# Altium schematic symbol library Capacitor - Aluminium TH.SchLib: 4591 symbols (part 14 of 27) (continued)
## SEK221M063ST (continued)
CAP ALUM 220UF 20% 63V RADIAL; Part Number: SEK221M063ST; Manufacturer: Cornell Dubilier Electronics (CDE); TemperatureRange: -55C ~ 105C; Ripple Current: 460mA; Value: 220uF; PartId: 25713; Supplier 1: Digi-Key; Supplier Part Number 1: 338-1737-ND; ComponentLink1Description: Datasheet; ComponentLink1URL: http://www.cde.com/resources/catalogs/SEK.pdf; ComponentLink2Description: Digi-Key Listing; ComponentLink2URL: https://www.digikey.com/product-detail/en/cornell-dubilier-electronics-cde/SEK221M063ST/338-1737-ND/1627155; Tolerance: 20%; Voltage: 63V; Price: 1.18; Device Package: Radial, Can, 10mm
footprint CAP AL TH D10 L5 H22
pins: 1, 2

## SEK221M100ST
designator C?, comment 220uF  (value not drawn)
CAP ALUM 220UF 20% 100V RADIAL; Part Number: SEK221M100ST; Manufacturer: Cornell Dubilier Electronics (CDE); TemperatureRange: -55C ~ 105C; Ripple Current: 590mA; Value: 220uF; PartId: 26713; Supplier 1: Digi-Key; Supplier Part Number 1: 338-2340-ND; ComponentLink1Description: Datasheet; ComponentLink1URL: http://www.cde.com/resources/catalogs/SEK.pdf; ComponentLink2Description: Digi-Key Listing; ComponentLink2URL: https://www.digikey.com/product-detail/en/cornell-dubilier-electronics-cde/SEK221M100ST/338-2340-ND/1627156; Tolerance: 20%; Voltage: 100V; Price: 2.45; Device Package: Radial, Can, 16mm
footprint CAP AL TH D16 L7.5 H26.5
pins: 1, 2

## SEK330M400ST
designator C?, comment 33uF  (value not drawn)
CAP ALUM 33UF 20% 400V RADIAL; Part Number: SEK330M400ST; Manufacturer: Cornell Dubilier Electronics (CDE); TemperatureRange: -40C ~ 105C; Ripple Current: 205mA; Value: 33uF; PartId: 27259; Supplier 1: Digi-Key; Supplier Part Number 1: 338-2346-ND; ComponentLink1Description: Datasheet; ComponentLink1URL: http://www.cde.com/resources/catalogs/SEK.pdf; ComponentLink2Description: Digi-Key Listing; ComponentLink2URL: https://www.digikey.com/product-detail/en/cornell-dubilier-electronics-cde/SEK330M400ST/338-2346-ND/1627183; Tolerance: 20%; Voltage: 400V; Price: 2.82; Device Package: Radial, Can, 16mm
footprint CAP AL TH D16 L7.5 H33.5
pins: 1, 2

## SEK331M035ST
designator C?, comment 330uF  (value not drawn)
CAP ALUM 330UF 20% 35V RADIAL; Part Number: SEK331M035ST; Manufacturer: Cornell Dubilier Electronics (CDE); TemperatureRange: -55C ~ 105C; Ripple Current: 440mA; Value: 330uF; PartId: 25425; Supplier 1: Digi-Key; Supplier Part Number 1: 338-1741-ND; ComponentLink1Description: Datasheet; ComponentLink1URL: http://www.cde.com/resources/catalogs/SEK.pdf; ComponentLink2Description: Digi-Key Listing; ComponentLink2URL: https://www.digikey.com/product-detail/en/cornell-dubilier-electronics-cde/SEK331M035ST/338-1741-ND/1627187; Tolerance: 20%; Voltage: 35V; Price: 1.03; Device Package: Radial, Can, 10mm
footprint CAP AL TH D10 L5 H17.5
pins: 1, 2

## SEK331M050ST
designator C?, comment 330uF  (value not drawn)
CAP ALUM 330UF 20% 50V RADIAL; Part Number: SEK331M050ST; Manufacturer: Cornell Dubilier Electronics (CDE); TemperatureRange: -55C ~ 105C; Ripple Current: 535mA; Value: 330uF; PartId: 25714; Supplier 1: Digi-Key; Supplier Part Number 1: 338-1748-ND; ComponentLink1Description: Datasheet; ComponentLink1URL: http://www.cde.com/resources/catalogs/SEK.pdf; ComponentLink2Description: Digi-Key Listing; ComponentLink2URL: https://www.digikey.com/product-detail/en/cornell-dubilier-electronics-cde/SEK331M050ST/338-1748-ND/1627188; Tolerance: 20%; Voltage: 50V; Price: 1.18; Device Package: Radial, Can, 10mm
footprint CAP AL TH D10 L5 H22
pins: 1, 2

## SEK331M100ST
designator C?, comment 330uF  (value not drawn)
CAP ALUM 330UF 20% 100V RADIAL; Part Number: SEK331M100ST; Manufacturer: Cornell Dubilier Electronics (CDE); TemperatureRange: -55C ~ 105C; Ripple Current: 720mA; Value: 330uF; PartId: 26728; Supplier 1: Digi-Key; Supplier Part Number 1: 338-2347-ND; ComponentLink1Description: Datasheet; ComponentLink1URL: http://www.cde.com/resources/catalogs/SEK.pdf; ComponentLink2Description: Digi-Key Listing; ComponentLink2URL: https://www.digikey.com/product-detail/en/cornell-dubilier-electronics-cde/SEK331M100ST/338-2347-ND/1627190; Tolerance: 20%; Voltage: 100V; Price: 2.92; Device Package: Radial, Can, 16mm
footprint CAP AL TH D16 L7.5 H26.5
pins: 1, 2

## SEK332M025ST
designator C?, comment 3300uF  (value not drawn)
CAP ALUM 3300UF 20% 25V RADIAL; Part Number: SEK332M025ST; Manufacturer: Cornell Dubilier Electronics (CDE); TemperatureRange: -55C ~ 105C; Ripple Current: 1.45A; Value: 3300uF; PartId: 27248; Supplier 1: Digi-Key; Supplier Part Number 1: 338-2349-ND; ComponentLink1Description: Datasheet; ComponentLink1URL: http://www.cde.com/resources/catalogs/SEK.pdf; ComponentLink2Description: Digi-Key Listing; ComponentLink2URL: https://www.digikey.com/product-detail/en/cornell-dubilier-electronics-cde/SEK332M025ST/338-2349-ND/1627195; Tolerance: 20%; Voltage: 25V; Price: 2.65; Device Package: Radial, Can, 16mm
footprint CAP AL TH D16 L7.5 H33.5
pins: 1, 2

## SEK470M100ST
designator C?, comment 47uF  (value not drawn)
CAP ALUM 47UF 20% 100V RADIAL; Part Number: SEK470M100ST; Manufacturer: Cornell Dubilier Electronics (CDE); TemperatureRange: -55C ~ 105C; Ripple Current: 210mA; Value: 47uF; PartId: 25416; Supplier 1: Digi-Key; Supplier Part Number 1: 338-2355-ND; ComponentLink1Description: Datasheet; ComponentLink1URL: http://www.cde.com/resources/catalogs/SEK.pdf; ComponentLink2Description: Digi-Key Listing; ComponentLink2URL: https://www.digikey.com/product-detail/en/cornell-dubilier-electronics-cde/SEK470M100ST/338-2355-ND/1627212; Tolerance: 20%; Voltage: 100V; Price: 0.95; Device Package: Radial, Can, 10mm
footprint CAP AL TH D10 L5 H17.5
pins: 1, 2

## SEK471M025ST
designator C?, comment 470uF  (value not drawn)
CAP ALUM 470UF 20% 25V RADIAL; Part Number: SEK471M025ST; Manufacturer: Cornell Dubilier Electronics (CDE); TemperatureRange: -55C ~ 105C; Ripple Current: 470mA; Value: 470uF; PartId: 25443; Supplier 1: Digi-Key; Supplier Part Number 1: 338-1715-ND; ComponentLink1Description: Datasheet; ComponentLink1URL: http://www.cde.com/resources/catalogs/SEK.pdf; ComponentLink2Description: Digi-Key Listing; ComponentLink2URL: https://www.digikey.com/product-detail/en/cornell-dubilier-electronics-cde/SEK471M025ST/338-1715-ND/1627220; Tolerance: 20%; Voltage: 25V; Price: 3.29; Device Package: Radial, Can, 10mm
footprint CAP AL TH D10 L5 H17.5
pins: 1, 2

## SEK472M016ST
designator C?, comment 4700uF  (value not drawn)
CAP ALUM 4700UF 20% 16V RADIAL; Part Number: SEK472M016ST; Manufacturer: Cornell Dubilier Electronics (CDE); TemperatureRange: -55C ~ 105C; Ripple Current: 1.56A; Value: 4700uF; PartId: 27285; Supplier 1: Digi-Key; Supplier Part Number 1: 338-2357-ND; ComponentLink1Description: Datasheet; ComponentLink1URL: http://www.cde.com/resources/catalogs/SEK.pdf; ComponentLink2Description: Digi-Key Listing; ComponentLink2URL: https://www.digikey.com/product-detail/en/cornell-dubilier-electronics-cde/SEK472M016ST/338-2357-ND/1627227; Tolerance: 20%; Voltage: 16V; Price: 3.23; Device Package: Radial, Can, 16mm
footprint CAP AL TH D16 L7.5 H33.5
pins: 1, 2

## SK2R2M450ST
designator C?, comment 2.2uF  (value not drawn)
CAP ALUM 2.2UF 20% 450V RADIAL; Part Number: SK2R2M450ST; Manufacturer: Cornell Dubilier Electronics (CDE); TemperatureRange: -25C ~ 85C; Ripple Current: 29mA; Value: 2.2uF; PartId: 25406; Supplier 1: Digi-Key; Supplier Part Number 1: 338-2384-ND; ComponentLink1Description: Datasheet; ComponentLink1URL: http://www.cde.com/resources/catalogs/SK.pdf; ComponentLink2Description: Digi-Key Listing; ComponentLink2URL: https://www.digikey.com/product-detail/en/cornell-dubilier-electronics-cde/SK2R2M450ST/338-2384-ND/1627453; Tolerance: 20%; Voltage: 450V; Price: 0.81; Device Package: Radial, Can, 10mm
footprint CAP AL TH D10 L5 H17.5
pins: 1, 2

## SK101M063ST
designator C?, comment 100uF  (value not drawn)
CAP ALUM 100UF 20% 63V RADIAL; Part Number: SK101M063ST; Manufacturer: Cornell Dubilier Electronics (CDE); TemperatureRange: -40C ~ 85C; Ripple Current: 300mA; Value: 100uF; PartId: 25441; Supplier 1: Digi-Key; Supplier Part Number 1: 338-1705-ND; ComponentLink1Description: Datasheet; ComponentLink1URL: http://www.cde.com/resources/catalogs/SK.pdf; ComponentLink2Description: Digi-Key Listing; ComponentLink2URL: https://www.digikey.com/product-detail/en/cornell-dubilier-electronics-cde/SK101M063ST/338-1705-ND/1627398; Tolerance: 20%; Voltage: 63V; Price: 2.41; Device Package: Radial, Can, 10mm
footprint CAP AL TH D10 L5 H17.5
pins: 1, 2

## SK101M200ST
designator C?, comment 100uF  (value not drawn)
CAP ALUM 100UF 20% 200V RADIAL; Part Number: SK101M200ST; Manufacturer: Cornell Dubilier Electronics (CDE); TemperatureRange: -25C ~ 85C; Ripple Current: 330mA; Value: 100uF; PartId: 26732; Supplier 1: Digi-Key; Supplier Part Number 1: 338-2372-ND; ComponentLink1Description: Datasheet; ComponentLink1URL: http://www.cde.com/resources/catalogs/SK.pdf; ComponentLink2Description: Digi-Key Listing; ComponentLink2URL: https://www.digikey.com/product-detail/en/cornell-dubilier-electronics-cde/SK101M200ST/338-2372-ND/1627401; Tolerance: 20%; Voltage: 200V; Price: 3.29; Device Package: Radial, Can, 16mm
footprint CAP AL TH D16 L7.5 H26.5
pins: 1, 2

## SK101M250ST
designator C?, comment 100uF  (value not drawn)
CAP ALUM 100UF 20% 250V RADIAL; Part Number: SK101M250ST; Manufacturer: Cornell Dubilier Electronics (CDE); TemperatureRange: -25C ~ 85C; Ripple Current: 310mA; Value: 100uF; PartId: 27444; Supplier 1: Digi-Key; Supplier Part Number 1: 338-2373-ND; ComponentLink1Description: Datasheet; ComponentLink1URL: http://www.cde.com/resources/catalogs/SK.pdf; ComponentLink2Description: Digi-Key Listing; ComponentLink2URL: https://www.digikey.com/product-detail/en/cornell-dubilier-electronics-cde/SK101M250ST/338-2373-ND/1627402; Tolerance: 20%; Voltage: 250V; Price: 3.57; Device Package: Radial, Can, 16mm
footprint CAP AL TH D16 L7.5 H37
pins: 1, 2

## SK102M010ST
designator C?, comment 1000uF  (value not drawn)
CAP ALUM 1000UF 20% 10V RADIAL; Part Number: SK102M010ST; Manufacturer: Cornell Dubilier Electronics (CDE); TemperatureRange: -40C ~ 85C; Ripple Current: 630mA; Value: 1000uF; PartId: 25706; Supplier 1: Digi-Key; Supplier Part Number 1: 338-2375-ND; ComponentLink1Description: Datasheet; ComponentLink1URL: http://www.cde.com/resources/catalogs/SK.pdf; ComponentLink2Description: Digi-Key Listing; ComponentLink2URL: https://www.digikey.com/product-detail/en/cornell-dubilier-electronics-cde/SK102M010ST/338-2375-ND/1627405; Tolerance: 20%; Voltage: 10V; Price: 0.98; Device Package: Radial, Can, 10mm
footprint CAP AL TH D10 L5 H22
pins: 1, 2

## SK102M050ST
designator C?, comment 1000uF  (value not drawn)
CAP ALUM 1000UF 20% 50V RADIAL; Part Number: SK102M050ST; Manufacturer: Cornell Dubilier Electronics (CDE); TemperatureRange: -40C ~ 85C; Ripple Current: 1.35A; Value: 1000uF; PartId: 26982; Supplier 1: Digi-Key; Supplier Part Number 1: 338-1688-ND; ComponentLink1Description: Datasheet; ComponentLink1URL: http://www.cde.com/resources/catalogs/SK.pdf; ComponentLink2Description: Digi-Key Listing; ComponentLink2URL: https://www.digikey.com/product-detail/en/cornell-dubilier-electronics-cde/SK102M050ST/338-1688-ND/1627409; Tolerance: 20%; Voltage: 50V; Price: 6.44; Device Package: Radial, Can, 16mm
footprint CAP AL TH D16 L7.5 H27
pins: 1, 2

## SK102M063ST
designator C?, comment 1000uF  (value not drawn)
CAP ALUM 1000UF 20% 63V RADIAL; Part Number: SK102M063ST; Manufacturer: Cornell Dubilier Electronics (CDE); TemperatureRange: -40C ~ 85C; Ripple Current: 1.55A; Value: 1000uF; PartId: 27433; Supplier 1: Digi-Key; Supplier Part Number 1: 338-2376-ND; ComponentLink1Description: Datasheet; ComponentLink1URL: http://www.cde.com/resources/catalogs/SK.pdf; ComponentLink2Description: Digi-Key Listing; ComponentLink2URL: https://www.digikey.com/product-detail/en/cornell-dubilier-electronics-cde/SK102M063ST/338-2376-ND/1627410; Tolerance: 20%; Voltage: 63V; Price: 3.26; Device Package: Radial, Can, 16mm
footprint CAP AL TH D16 L7.5 H37
pins: 1, 2

## SK221M035ST
designator C?, comment 220uF  (value not drawn)
CAP ALUM 220UF 20% 35V RADIAL; Part Number: SK221M035ST; Manufacturer: Cornell Dubilier Electronics (CDE); TemperatureRange: -40C ~ 85C; Ripple Current: 370mA; Value: 220uF; PartId: 25440; Supplier 1: Digi-Key; Supplier Part Number 1: 338-1666-ND; ComponentLink1Description: Datasheet; ComponentLink1URL: http://www.cde.com/resources/catalogs/SK.pdf; ComponentLink2Description: Digi-Key Listing; ComponentLink2URL: https://www.digikey.com/product-detail/en/cornell-dubilier-electronics-cde/SK221M035ST/338-1666-ND/1627432; Tolerance: 20%; Voltage: 35V; Price: 2.35; Device Package: Radial, Can, 10mm
footprint CAP AL TH D10 L5 H17.5
pins: 1, 2

## SK221M050ST
designator C?, comment 220uF  (value not drawn)
CAP ALUM 220UF 20% 50V RADIAL; Part Number: SK221M050ST; Manufacturer: Cornell Dubilier Electronics (CDE); TemperatureRange: -40C ~ 85C; Ripple Current: 440mA; Value: 220uF; PartId: 25721; Supplier 1: Digi-Key; Supplier Part Number 1: 338-1674-ND; ComponentLink1Description: Datasheet; ComponentLink1URL: http://www.cde.com/resources/catalogs/SK.pdf; ComponentLink2Description: Digi-Key Listing; ComponentLink2URL: https://www.digikey.com/product-detail/en/cornell-dubilier-electronics-cde/SK221M050ST/338-1674-ND/1627433; Tolerance: 20%; Voltage: 50V; Price: 3.26; Device Package: Radial, Can, 10mm
footprint CAP AL TH D10 L5 H22
pins: 1, 2

## SK221M063ST
designator C?, comment 220uF  (value not drawn)
CAP ALUM 220UF 20% 63V RADIAL; Part Number: SK221M063ST; Manufacturer: Cornell Dubilier Electronics (CDE); TemperatureRange: -40C ~ 85C; Ripple Current: 490mA; Value: 220uF; PartId: 26187; Supplier 1: Digi-Key; Supplier Part Number 1: 338-2378-ND; ComponentLink1Description: Datasheet; ComponentLink1URL: http://www.cde.com/resources/catalogs/SK.pdf; ComponentLink2Description: Digi-Key Listing; ComponentLink2URL: https://www.digikey.com/product-detail/en/cornell-dubilier-electronics-cde/SK221M063ST/338-2378-ND/1627434; Tolerance: 20%; Voltage: 63V; Price: 1.06; Device Package: Radial, Can, 10mm
footprint CAP AL TH D10 L5 H30
pins: 1, 2

## SK221M100ST
designator C?, comment 220uF  (value not drawn)
CAP ALUM 220UF 20% 100V RADIAL; Part Number: SK221M100ST; Manufacturer: Cornell Dubilier Electronics (CDE); TemperatureRange: -40C ~ 85C; Ripple Current: 710mA; Value: 220uF; PartId: 26964; Supplier 1: Digi-Key; Supplier Part Number 1: 338-1701-ND; ComponentLink1Description: Datasheet; ComponentLink1URL: http://www.cde.com/resources/catalogs/SK.pdf; ComponentLink2Description: Digi-Key Listing; ComponentLink2URL: https://www.digikey.com/product-detail/en/cornell-dubilier-electronics-cde/SK221M100ST/338-1701-ND/1627435; Tolerance: 20%; Voltage: 100V; Price: 2.35; Device Package: Radial, Can, 16mm
footprint CAP AL TH D16 L7.5 H27
pins: 1, 2

## SK222M010ST
designator C?, comment 2200uF  (value not drawn)
CAP ALUM 2200UF 20% 10V RADIAL; Part Number: SK222M010ST; Manufacturer: Cornell Dubilier Electronics (CDE); TemperatureRange: -40C ~ 85C; Ripple Current: 1.1A; Value: 2200uF; PartId: 26199; Supplier 1: Digi-Key; Supplier Part Number 1: 338-2379-ND; ComponentLink1Description: Datasheet; ComponentLink1URL: http://www.cde.com/resources/catalogs/SK.pdf; ComponentLink2Description: Digi-Key Listing; ComponentLink2URL: https://www.digikey.com/product-detail/en/cornell-dubilier-electronics-cde/SK222M010ST/338-2379-ND/1627439; Tolerance: 20%; Voltage: 10V; Price: 1.6; Device Package: Radial, Can, 10mm
footprint CAP AL TH D10 L5 H30
pins: 1, 2

## SK222M035ST
designator C?, comment 2200uF  (value not drawn)
CAP ALUM 2200UF 20% 35V RADIAL; Part Number: SK222M035ST; Manufacturer: Cornell Dubilier Electronics (CDE); TemperatureRange: -40C ~ 85C; Ripple Current: 1.8A; Value: 2200uF; PartId: 27455; Supplier 1: Digi-Key; Supplier Part Number 1: 338-1707-ND; ComponentLink1Description: Datasheet; ComponentLink1URL: http://www.cde.com/resources/catalogs/SK.pdf; ComponentLink2Description: Digi-Key Listing; ComponentLink2URL: https://www.digikey.com/product-detail/en/cornell-dubilier-electronics-cde/SK222M035ST/338-1707-ND/1627442; Tolerance: 20%; Voltage: 35V; Price: 8.89; Device Package: Radial, Can, 16mm
footprint CAP AL TH D16 L7.5 H37
pins: 1, 2

## SK331M025ST
designator C?, comment 330uF  (value not drawn)
CAP ALUM 330UF 20% 25V RADIAL; Part Number: SK331M025ST; Manufacturer: Cornell Dubilier Electronics (CDE); TemperatureRange: -40C ~ 85C; Ripple Current: 420mA; Value: 330uF; PartId: 25390; Supplier 1: Digi-Key; Supplier Part Number 1: 338-1690-ND; ComponentLink1Description: Datasheet; ComponentLink1URL: http://www.cde.com/resources/catalogs/SK.pdf; ComponentLink2Description: Digi-Key Listing; ComponentLink2URL: https://www.digikey.com/product-detail/en/cornell-dubilier-electronics-cde/SK331M025ST/338-1690-ND/1627469; Tolerance: 20%; Voltage: 25V; Price: 0.77; Device Package: Radial, Can, 10mm
footprint CAP AL TH D10 L5 H17.5
pins: 1, 2

## SK331M035ST
designator C?, comment 330uF  (value not drawn)
CAP ALUM 330UF 20% 35V RADIAL; Part Number: SK331M035ST; Manufacturer: Cornell Dubilier Electronics (CDE); TemperatureRange: -40C ~ 85C; Ripple Current: 490mA; Value: 330uF; PartId: 25723; Supplier 1: Digi-Key; Supplier Part Number 1: 338-1665-ND; ComponentLink1Description: Datasheet; ComponentLink1URL: http://www.cde.com/resources/catalogs/SK.pdf; ComponentLink2Description: Digi-Key Listing; ComponentLink2URL: https://www.digikey.com/product-detail/en/cornell-dubilier-electronics-cde/SK331M035ST/338-1665-ND/1627470; Tolerance: 20%; Voltage: 35V; Price: 3.37; Device Package: Radial, Can, 10mm
footprint CAP AL TH D10 L5 H22
pins: 1, 2

## SK331M050ST
designator C?, comment 330uF  (value not drawn)
CAP ALUM 330UF 20% 50V RADIAL; Part Number: SK331M050ST; Manufacturer: Cornell Dubilier Electronics (CDE); TemperatureRange: -40C ~ 85C; Ripple Current: 580mA; Value: 330uF; PartId: 26205; Supplier 1: Digi-Key; Supplier Part Number 1: 338-2388-ND; ComponentLink1Description: Datasheet; ComponentLink1URL: http://www.cde.com/resources/catalogs/SK.pdf; ComponentLink2Description: Digi-Key Listing; ComponentLink2URL: https://www.digikey.com/product-detail/en/cornell-dubilier-electronics-cde/SK331M050ST/338-2388-ND/1627471; Tolerance: 20%; Voltage: 50V; Price: 4; Device Package: Radial, Can, 10mm
footprint CAP AL TH D10 L5 H30
pins: 1, 2

## SK471M016ST
designator C?, comment 470uF  (value not drawn)
CAP ALUM 470UF 20% 16V RADIAL; Part Number: SK471M016ST; Manufacturer: Cornell Dubilier Electronics (CDE); TemperatureRange: -40C ~ 85C; Type: Polar; Ripple Current: 470mA @ 120Hz; Value: 470uF; PartId: 25388; Supplier 1: Digi-Key; Supplier Part Number 1: 338-1678-ND; ComponentLink1Description: Datasheet; ComponentLink1URL: http://www.cde.com/resources/catalogs/SK.pdf; ComponentLink2Description: Digi-Key Listing; ComponentLink2URL: https://www.digikey.com/product-detail/en/cornell-dubilier-electronics-cde/SK471M016ST/338-1678-ND/1627505; Tolerance: 20%; Voltage: 16V; Price: 0.77; Device Package: Radial, Can, 10mm
footprint CAP AL TH D10 L5 H17.5
pins: 1, 2

## SK471M025ST
designator C?, comment 470uF  (value not drawn)
CAP ALUM 470UF 20% 25V RADIAL; Part Number: SK471M025ST; Manufacturer: Cornell Dubilier Electronics (CDE); TemperatureRange: -40C ~ 85C; Ripple Current: 540mA; Value: 470uF; PartId: 25722; Supplier 1: Digi-Key; Supplier Part Number 1: 338-1682-ND; ComponentLink1Description: Datasheet; ComponentLink1URL: http://www.cde.com/resources/catalogs/SK.pdf; ComponentLink2Description: Digi-Key Listing; ComponentLink2URL: https://www.digikey.com/product-detail/en/cornell-dubilier-electronics-cde/SK471M025ST/338-1682-ND/1627506; Tolerance: 20%; Voltage: 25V; Price: 3.3; Device Package: Radial, Can, 10mm
footprint CAP AL TH D10 L5 H22
pins: 1, 2

## SK471M035ST
designator C?, comment 470uF  (value not drawn)
CAP ALUM 470UF 20% 35V RADIAL; Part Number: SK471M035ST; Manufacturer: Cornell Dubilier Electronics (CDE); TemperatureRange: -40C ~ 85C; Ripple Current: 640mA; Value: 470uF; PartId: 26204; Supplier 1: Digi-Key; Supplier Part Number 1: 338-1664-ND; ComponentLink1Description: Datasheet; ComponentLink1URL: http://www.cde.com/resources/catalogs/SK.pdf; ComponentLink2Description: Digi-Key Listing; ComponentLink2URL: https://www.digikey.com/product-detail/en/cornell-dubilier-electronics-cde/SK471M035ST/338-1664-ND/1627507; Tolerance: 20%; Voltage: 35V; Price: 3.44; Device Package: Radial, Can, 10mm
footprint CAP AL TH D10 L5 H30
pins: 1, 2

## SK471M100ST
designator C?, comment 470uF  (value not drawn)
CAP ALUM 470UF 20% 100V RADIAL; Part Number: SK471M100ST; Manufacturer: Cornell Dubilier Electronics (CDE); TemperatureRange: -40C ~ 85C; Ripple Current: 1.1A; Value: 470uF; PartId: 27448; Supplier 1: Digi-Key; Supplier Part Number 1: 338-1702-ND; ComponentLink1Description: Datasheet; ComponentLink1URL: http://www.cde.com/resources/catalogs/SK.pdf; ComponentLink2Description: Digi-Key Listing; ComponentLink2URL: https://www.digikey.com/product-detail/en/cornell-dubilier-electronics-cde/SK471M100ST/338-1702-ND/1627510; Tolerance: 20%; Voltage: 100V; Price: 4.12; Device Package: Radial, Can, 16mm
footprint CAP AL TH D16 L7.5 H37
pins: 1, 2

## SK472M016ST
designator C?, comment 4700uF  (value not drawn)
CAP ALUM 4700UF 20% 16V RADIAL; Part Number: SK472M016ST; Manufacturer: Cornell Dubilier Electronics (CDE); TemperatureRange: -40C ~ 85C; Ripple Current: 2.1A; Value: 4700uF; PartId: 27437; Supplier 1: Digi-Key; Supplier Part Number 1: 338-2393-ND; ComponentLink1Description: Datasheet; ComponentLink1URL: http://www.cde.com/resources/catalogs/SK.pdf; ComponentLink2Description: Digi-Key Listing; ComponentLink2URL: https://www.digikey.com/product-detail/en/cornell-dubilier-electronics-cde/SK472M016ST/338-2393-ND/1627513; Tolerance: 20%; Voltage: 16V; Price: 3.33; Device Package: Radial, Can, 16mm
footprint CAP AL TH D16 L7.5 H37
pins: 1, 2

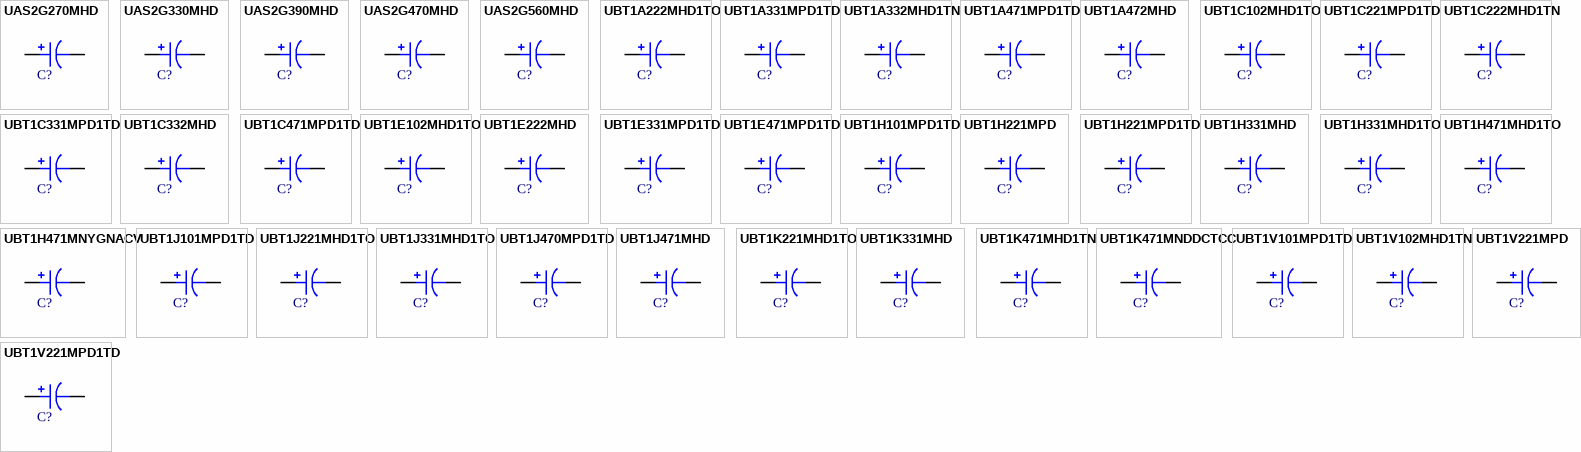
[diagram p58: symbols UAS2G270MHD to UBT1V221MPD1TD]

## UAS2G270MHD
designator C?, comment 27uF  (value not drawn)
CAP ALUM 27UF 20% 400V RADIAL; Part Number: UAS2G270MHD; Manufacturer: Nichicon; TemperatureRange: -40C ~ 105C; Type: Polar; Ripple Current: 200mA @ 120Hz; Value: 27uF; PartId: 24173; Supplier 1: Digi-Key; Supplier Part Number 1: 493-7483-ND; ComponentLink1Description: Datasheet; ComponentLink1URL: http://nichicon-us.com/english/products/pdfs/e-uas.pdf; ComponentLink2Description: Digi-Key Listing; ComponentLink2URL: https://www.digikey.com/product-detail/en/nichicon/UAS2G270MHD/493-7483-ND/3782028; Tolerance: 20%; Voltage: 400V; Price: 1.74; Device Package: Radial, Can, 12.5mm
footprint CAP AL TH D12.5 L5 H27
pins: 1, 2

## UAS2G330MHD
designator C?, comment 33uF  (value not drawn)
CAP ALUM 33UF 20% 400V RADIAL; Part Number: UAS2G330MHD; Manufacturer: Nichicon; TemperatureRange: -40C ~ 105C; Type: Polar; Ripple Current: 225mA @ 120Hz; Value: 33uF; PartId: 26482; Supplier 1: Digi-Key; Supplier Part Number 1: 493-7484-ND; ComponentLink1Description: Datasheet; ComponentLink1URL: //media.digikey.com/pdf/Data%20Sheets/Nichicon%20PDFs/UAS2G330MHD.PDF; ComponentLink2Description: Digi-Key Listing; ComponentLink2URL: https://www.digikey.com/product-detail/en/nichicon/UAS2G330MHD/493-7484-ND/3782029; Tolerance: 20%; Voltage: 400V; Price: 1.8; Device Package: Radial, Can, 16mm
footprint CAP AL TH D16 L7.5 H22
pins: 1, 2

## UAS2G390MHD
designator C?, comment 39uF  (value not drawn)
CAP ALUM 39UF 20% 400V RADIAL; Part Number: UAS2G390MHD; Manufacturer: Nichicon; TemperatureRange: -40C ~ 105C; Type: Polar; Ripple Current: 255mA @ 120Hz; Value: 39uF; PartId: 26949; Supplier 1: Digi-Key; Supplier Part Number 1: 493-7485-ND; ComponentLink1Description: Datasheet; ComponentLink1URL: http://nichicon-us.com/english/products/pdfs/e-uas.pdf; ComponentLink2Description: Digi-Key Listing; ComponentLink2URL: https://www.digikey.com/product-detail/en/nichicon/UAS2G390MHD/493-7485-ND/3782030; Tolerance: 20%; Voltage: 400V; Price: 2.03; Device Package: Radial, Can, 16mm
footprint CAP AL TH D16 L7.5 H27
pins: 1, 2

## UAS2G470MHD
designator C?, comment 47uF  (value not drawn)
CAP ALUM 47UF 20% 400V RADIAL; Part Number: UAS2G470MHD; Manufacturer: Nichicon; TemperatureRange: -40C ~ 105C; Type: Polar; Ripple Current: 290mA @ 120Hz; Value: 47uF; PartId: 26948; Supplier 1: Digi-Key; Supplier Part Number 1: 493-7487-ND; ComponentLink1Description: Datasheet; ComponentLink1URL: http://nichicon-us.com/english/products/pdfs/e-uas.pdf; ComponentLink2Description: Digi-Key Listing; ComponentLink2URL: https://www.digikey.com/product-detail/en/nichicon/UAS2G470MHD/493-7487-ND/3782032; Tolerance: 20%; Voltage: 400V; Price: 2.03; Device Package: Radial, Can, 16mm
footprint CAP AL TH D16 L7.5 H27
pins: 1, 2

## UAS2G560MHD
designator C?, comment 56uF  (value not drawn)
CAP ALUM 56UF 20% 400V RADIAL; Part Number: UAS2G560MHD; Manufacturer: Nichicon; TemperatureRange: -40C ~ 105C; Type: Polar; Ripple Current: 340mA @ 120Hz; Value: 56uF; PartId: 27227; Supplier 1: Digi-Key; Supplier Part Number 1: 493-7489-ND; ComponentLink1Description: Datasheet; ComponentLink1URL: http://nichicon-us.com/english/products/pdfs/e-uas.pdf; ComponentLink2Description: Digi-Key Listing; ComponentLink2URL: https://www.digikey.com/product-detail/en/nichicon/UAS2G560MHD/493-7489-ND/3782034; Tolerance: 20%; Voltage: 400V; Price: 2.38; Device Package: Radial, Can, 16mm
footprint CAP AL TH D16 L7.5 H33.5
pins: 1, 2

## UBT1A222MHD1TO
designator C?, comment 2200uF  (value not drawn)
CAP ALUM 2200UF 20% 10V RADIAL; Part Number: UBT1A222MHD1TO; Manufacturer: Nichicon; TemperatureRange: -40C ~ 125C; Type: Polar; Ripple Current: 1.172A @ 120Hz; Impedance: 33 mOhm; Value: 2200uF; PartId: 23849; Supplier 1: Digi-Key; Supplier Part Number 1: 493-4489-3-ND; ComponentLink1Description: Datasheet; ComponentLink1URL: http://nichicon-us.com/english/products/pdfs/e-ubt.pdf; ComponentLink2Description: Digi-Key Listing; ComponentLink2URL: https://www.digikey.com/product-detail/en/nichicon/UBT1A222MHD1TO/493-4489-3-ND/2649077; Tolerance: 20%; Voltage: 10V; Price: 0.6011; Device Package: Radial, Can, 12.5mm
footprint CAP AL TH D12.5 L5 H27
pins: 1, 2

## UBT1A331MPD1TD
designator C?, comment 330uF  (value not drawn)
CAP ALUM 330UF 20% 10V RADIAL; Part Number: UBT1A331MPD1TD; Manufacturer: Nichicon; TemperatureRange: -40C ~ 125C; Type: Polar; Ripple Current: 310mA @ 120Hz; Impedance: 150 mOhm; Value: 330uF; PartId: 24647; Supplier 1: Digi-Key; Supplier Part Number 1: 493-4486-3-ND; ComponentLink1Description: Datasheet; ComponentLink1URL: http://nichicon-us.com/english/products/pdfs/e-ubt.pdf; ComponentLink2Description: Digi-Key Listing; ComponentLink2URL: https://www.digikey.com/product-detail/en/nichicon/UBT1A331MPD1TD/493-4486-3-ND/2649074; Tolerance: 20%; Voltage: 10V; Price: 0.2479; Device Package: Radial, Can, 10mm
footprint CAP AL TH D10 L5 H14.5
pins: 1, 2

## UBT1A332MHD1TN
designator C?, comment 3300uF  (value not drawn)
CAP ALUM 3300UF 20% 10V RADIAL; Part Number: UBT1A332MHD1TN; Manufacturer: Nichicon; TemperatureRange: -40C ~ 125C; Type: Polar; Ripple Current: 1.541A @ 120Hz; Impedance: 24 mOhm; Value: 3300uF; PartId: 26822; Supplier 1: Digi-Key; Supplier Part Number 1: 493-4490-3-ND; ComponentLink1Description: Datasheet; ComponentLink1URL: http://nichicon-us.com/english/products/pdfs/e-ubt.pdf; ComponentLink2Description: Digi-Key Listing; ComponentLink2URL: https://www.digikey.com/product-detail/en/nichicon/UBT1A332MHD1TN/493-4490-3-ND/2649078; Tolerance: 20%; Voltage: 10V; Price: 0.9766; Device Package: Radial, Can, 16mm
footprint CAP AL TH D16 L7.5 H27
pins: 1, 2

## UBT1A471MPD1TD
designator C?, comment 470uF  (value not drawn)
CAP ALUM 470UF 20% 10V RADIAL; Part Number: UBT1A471MPD1TD; Manufacturer: Nichicon; TemperatureRange: -40C ~ 125C; Type: Polar; Ripple Current: 340mA @ 120Hz; Impedance: 100 mOhm; Value: 470uF; PartId: 24646; Supplier 1: Digi-Key; Supplier Part Number 1: 493-4487-3-ND; ComponentLink1Description: Datasheet; ComponentLink1URL: http://nichicon-us.com/english/products/pdfs/e-ubt.pdf; ComponentLink2Description: Digi-Key Listing; ComponentLink2URL: https://www.digikey.com/product-detail/en/nichicon/UBT1A471MPD1TD/493-4487-3-ND/2649075; Tolerance: 20%; Voltage: 10V; Price: 0.2479; Device Package: Radial, Can, 10mm
footprint CAP AL TH D10 L5 H14.5
pins: 1, 2

## UBT1A472MHD
designator C?, comment 4700uF  (value not drawn)
CAP ALUM 4700UF 20% 10V RADIAL; Part Number: UBT1A472MHD; Manufacturer: Nichicon; TemperatureRange: -40C ~ 125C; Type: Polar; Ripple Current: 1.816A @ 120Hz; Impedance: 20 mOhm; Value: 4700uF; PartId: 27190; Supplier 1: Digi-Key; Supplier Part Number 1: 493-13032-ND; ComponentLink1Description: Datasheet; ComponentLink1URL: http://nichicon-us.com/english/products/pdfs/e-ubt.pdf; ComponentLink2Description: Digi-Key Listing; ComponentLink2URL: https://www.digikey.com/product-detail/en/nichicon/UBT1A472MHD/493-13032-ND/2597389; Tolerance: 20%; Voltage: 10V; Price: 2.03; Device Package: Radial, Can, 16mm
footprint CAP AL TH D16 L7.5 H33.5
pins: 1, 2

## UBT1C102MHD1TO
designator C?, comment 1000uF  (value not drawn)
CAP ALUM 1000UF 20% 16V RADIAL; Part Number: UBT1C102MHD1TO; Manufacturer: Nichicon; TemperatureRange: -40C ~ 125C; Type: Polar; Ripple Current: 998.3mA @ 120Hz; Impedance: 42 mOhm; Value: 1000uF; PartId: 23197; Supplier 1: Digi-Key; Supplier Part Number 1: 493-4494-3-ND; ComponentLink1Description: Datasheet; ComponentLink1URL: http://nichicon-us.com/english/products/pdfs/e-ubt.pdf; ComponentLink2Description: Digi-Key Listing; ComponentLink2URL: https://www.digikey.com/product-detail/en/nichicon/UBT1C102MHD1TO/493-4494-3-ND/2649082; Tolerance: 20%; Voltage: 16V; Price: 0.4482; Device Package: Radial, Can, 12.5mm
footprint CAP AL TH D12.5 L5 H22
pins: 1, 2

## UBT1C221MPD1TD
designator C?, comment 220uF  (value not drawn)
CAP ALUM 220UF 20% 16V RADIAL; Part Number: UBT1C221MPD1TD; Manufacturer: Nichicon; TemperatureRange: -40C ~ 125C; Type: Polar; Ripple Current: 310mA @ 120Hz; Impedance: 150 mOhm; Value: 220uF; PartId: 24648; Supplier 1: Digi-Key; Supplier Part Number 1: 493-13098-3-ND; ComponentLink1Description: Datasheet; ComponentLink1URL: http://nichicon-us.com/english/products/pdfs/e-ubt.pdf; ComponentLink2Description: Digi-Key Listing; ComponentLink2URL: https://www.digikey.com/product-detail/en/nichicon/UBT1C221MPD1TD/493-13098-3-ND/4332729; Tolerance: 20%; Voltage: 16V; Price: 0.2479; Device Package: Radial, Can, 10mm
footprint CAP AL TH D10 L5 H14.5
pins: 1, 2

## UBT1C222MHD1TN
designator C?, comment 2200uF  (value not drawn)
CAP ALUM 2200UF 20% 16V RADIAL; Part Number: UBT1C222MHD1TN; Manufacturer: Nichicon; TemperatureRange: -40C ~ 125C; Type: Polar; Ripple Current: 1.541A @ 120Hz; Impedance: 24 mOhm; Value: 2200uF; PartId: 26816; Supplier 1: Digi-Key; Supplier Part Number 1: 493-4495-3-ND; ComponentLink1Description: Datasheet; ComponentLink1URL: http://nichicon-us.com/english/products/pdfs/e-ubt.pdf; ComponentLink2Description: Digi-Key Listing; ComponentLink2URL: https://www.digikey.com/product-detail/en/nichicon/UBT1C222MHD1TN/493-4495-3-ND/2649083; Tolerance: 20%; Voltage: 16V; Price: 0.9606; Device Package: Radial, Can, 16mm
footprint CAP AL TH D16 L7.5 H27
pins: 1, 2

## UBT1C331MPD1TD
designator C?, comment 330uF  (value not drawn)
CAP ALUM 330UF 20% 16V RADIAL; Part Number: UBT1C331MPD1TD; Manufacturer: Nichicon; TemperatureRange: -40C ~ 125C; Type: Polar; Ripple Current: 340mA @ 120Hz; Impedance: 100 mOhm; Value: 330uF; PartId: 24645; Supplier 1: Digi-Key; Supplier Part Number 1: 493-4492-3-ND; ComponentLink1Description: Datasheet; ComponentLink1URL: http://nichicon-us.com/english/products/pdfs/e-ubt.pdf; ComponentLink2Description: Digi-Key Listing; ComponentLink2URL: https://www.digikey.com/product-detail/en/nichicon/UBT1C331MPD1TD/493-4492-3-ND/2649080; Tolerance: 20%; Voltage: 16V; Price: 0.2479; Device Package: Radial, Can, 10mm
footprint CAP AL TH D10 L5 H14.5
pins: 1, 2

## UBT1C332MHD
designator C?, comment 3300uF  (value not drawn)
CAP ALUM 3300UF 20% 16V RADIAL; Part Number: UBT1C332MHD; Manufacturer: Nichicon; TemperatureRange: -40C ~ 125C; Type: Polar; Ripple Current: 1.816A @ 120Hz; Impedance: 20 mOhm; Value: 3300uF; PartId: 27199; Supplier 1: Digi-Key; Supplier Part Number 1: 493-4478-ND; ComponentLink1Description: Datasheet; ComponentLink1URL: http://nichicon-us.com/english/products/pdfs/e-ubt.pdf; ComponentLink2Description: Digi-Key Listing; ComponentLink2URL: https://www.digikey.com/product-detail/en/nichicon/UBT1C332MHD/493-4478-ND/2597395; Tolerance: 20%; Voltage: 16V; Price: 2.07; Device Package: Radial, Can, 16mm
footprint CAP AL TH D16 L7.5 H33.5
pins: 1, 2

## UBT1C471MPD1TD
designator C?, comment 470uF  (value not drawn)